# Altium footprint library miniFOC-foc_pcblib.PcbLib: 55 footprints (part 2 of 4)
Each footprint in its own frame and in the unit in brackets; x right, y up, seen from the top. Pads: shape width x height; smd on the part's side, far side on the other; paste and mask are expansions set on the pad; w line width, h text height; cw(c..) or ccw(c..) is an arc to the next point about the centre after c.
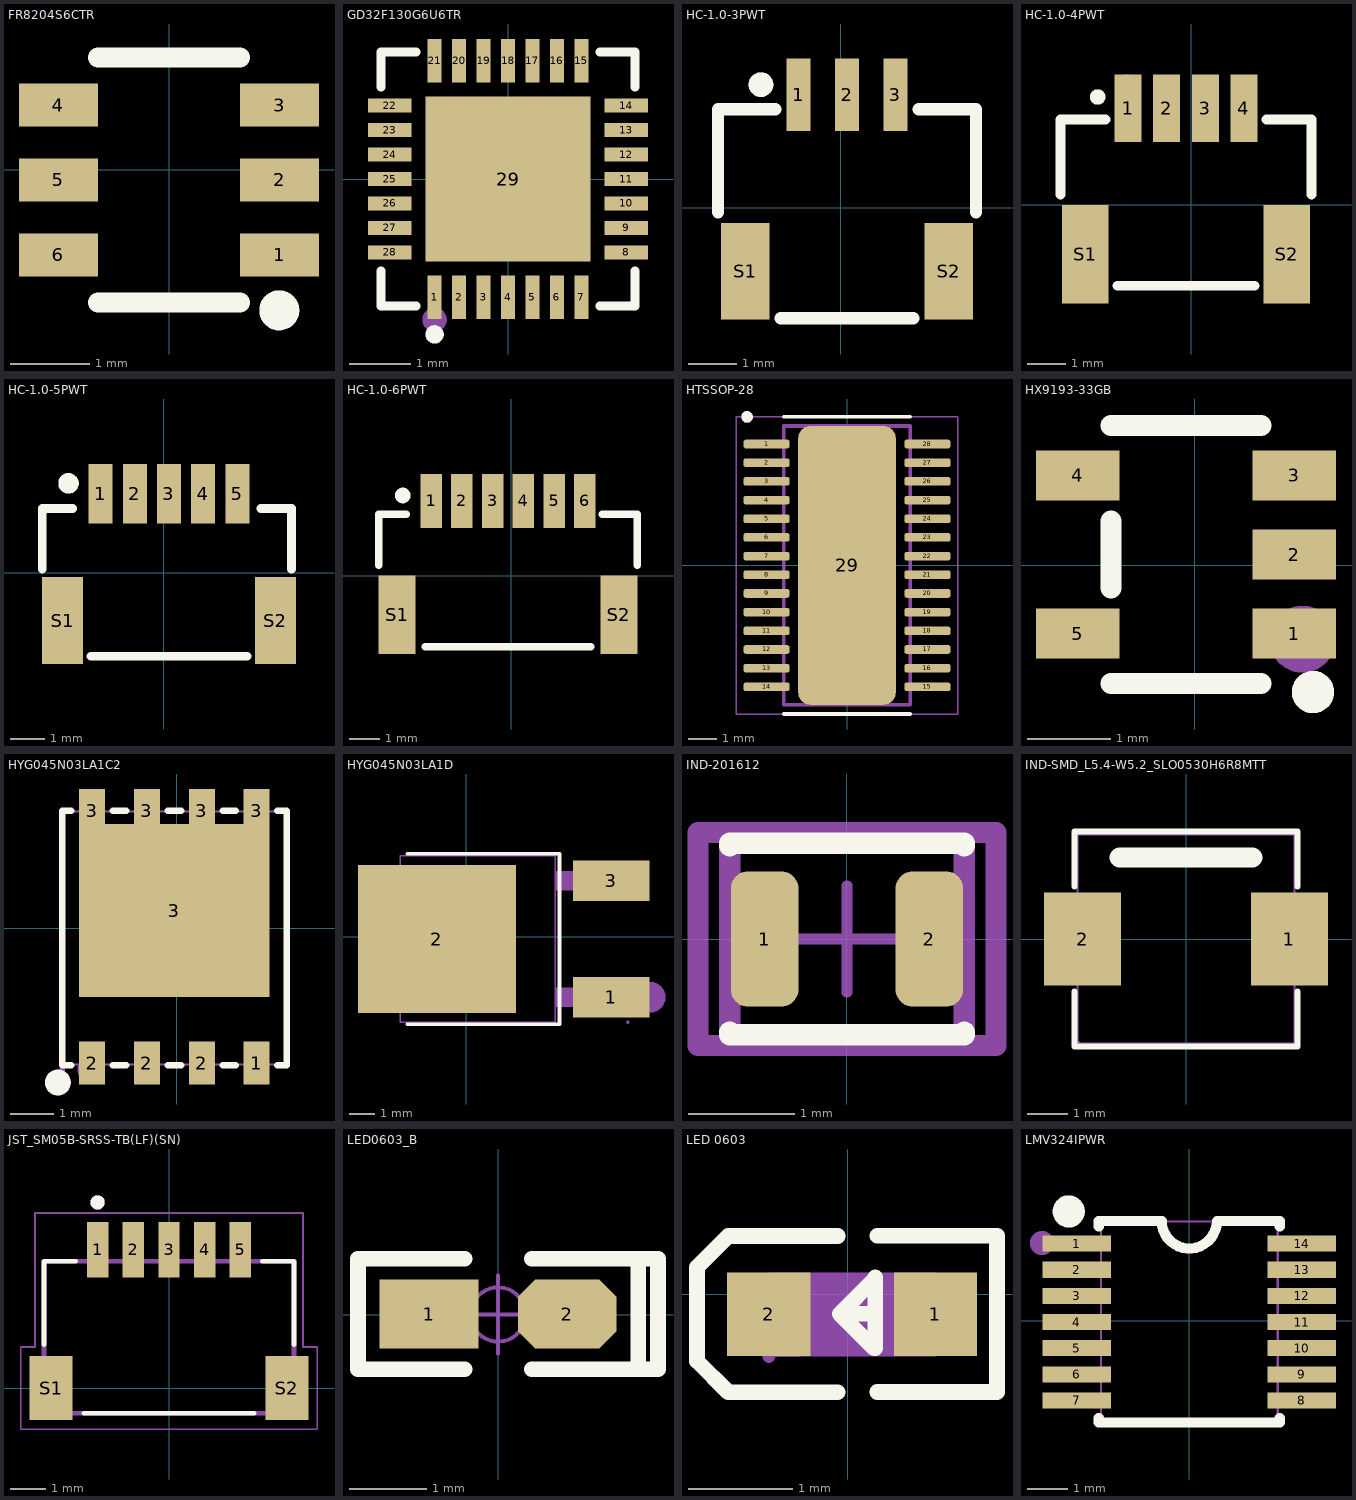
[diagram p1: the footprints below, top view; thin cyan lines are the x and y axes]

## FR8204S6CTR [mm] "SOT-23-6, DC/DC Buck"
pads (6):
  rect 1x0.55 smd: 1(1.395,-1.077) 2(1.395,-0.127) 3(1.395,0.823) 4(-1.405,0.823) 5(-1.405,-0.127) 6(-1.405,-1.077)
Top Overlay:
  circle w0.254: c1.392,-1.778 r0.127
  lines w0.254: -0.905,-1.677 0.895,-1.677 ; -0.905,1.423 0.895,1.423
Mechanical 15:
  circle w0.2: c1.395,-1.077 r0.1
3D body "SOT-23-6.STEP": height 1, standoff 0, extent -1.212,-1.609 1.175,1.291

## GD32F130G6U6TR [mil] "QFN 28 pin,s ARM Cortex-M3 RISC MCU"
pads (29):
  rect 8.82x28 smd: 1(-47.24,-76.1) 2(-31.5,-76.1) 3(-15.75,-76.1) 4(0,-76.1) 5(15.75,-76.1) 6(31.5,-76.1) 7(47.24,-76.1) 15(47.24,76.1) 16(31.5,76.1) 17(15.75,76.1) 18(0,76.1) 19(-15.75,76.1) 20(-31.5,76.1) 21(-47.24,76.1)
  rect 28x8.82 smd: 8(76.1,-47.24) 9(76.1,-31.5) 10(76.1,-15.75) 11(76.1,0) 12(76.1,15.75) 13(76.1,31.5) 14(76.1,47.24) 22(-76.1,47.24) 23(-76.1,31.5) 24(-76.1,15.75) 25(-76.1,0) 26(-76.1,-15.75) 27(-76.1,-31.5) 28(-76.1,-47.24)
  rect 106.3x106.3 smd: 29(0,0)
Top Overlay:
  circle w5.91: c-47.24,-100 r2.95
  lines w6: -81.74,-59.15 -81.74,-81.74 -59.15,-81.74 ; -81.74,59.15 -81.74,81.74 -59.15,81.74 ; 59.15,-81.74 81.74,-81.74 81.74,-59.15 ; 59.15,81.74 81.74,81.74 81.74,59.15
Mechanical 15:
  circle w7.87: c-47.24,-90.55 r3.94
3D body "QFN-28 (4x4x0.9).step": height 36.22, standoff 0, extent -78.43,-78.48 79.05,79

## HC-1.0-3PWT [mm] "HC-1.0-3PWT SMD,P=1mm"
pads (5):
  rect 0.5x1.5 smd: 1(-0.873,2.333) 2(0.127,2.333) 3(1.127,2.333)
  rect 1x2 smd: S1(-1.973,-1.317) S2(2.227,-1.317)
Top Overlay:
  circle w0.254: c-1.651,2.54 r0.127
  lines w0.254: -2.54,-0.096 -2.54,2.032 -1.354,2.032 ; -1.242,-2.286 1.496,-2.286 ; 1.608,2.032 2.794,2.032 2.794,-0.096
Mechanical 15:
  circle w0.254: c-1.651,2.54 r0.127
3D body "SM03B-SRSS-TB(LF)(SN)--3DModel-STEP-56544.STEP": height 3.25, standoff 0.3, extent -2.373,-2.244 2.627,2.706

## HC-1.0-4PWT [mm] "HC-1.0-4PWT SMD,P=1mm"
pads (6):
  rect 0.7x1.75 smd: 1(-1.642,2.502) 2(-0.642,2.502) 3(0.358,2.502) 4(1.358,2.502)
  rect 1.2x2.55 smd: S1(-2.752,-1.287) S2(2.468,-1.287)
Top Overlay:
  circle w0.2: c-2.428,2.791 r0.1
  lines w0.254: -3.392,0.264 -3.392,2.207 -2.223,2.207 -2.853,2.207 ; -1.921,-2.098 1.637,-2.098 ; 1.939,2.207 3.108,2.207 3.108,0.264
Mechanical 15:
  circle w0.2: c-1.666,3.172 r0.1
3D body "SM04B-SRSS-TB(LF)(SN)--3DModel-STEP-56544.STEP": height 3.25, standoff 0.3, extent -3.127,-2.498 2.873,2.452

## HC-1.0-5PWT [mm] "HC-1.0-5PWT SMD,P=1mm"
pads (7):
  rect 0.7x1.75 smd: 1(-1.849,2.318) 2(-0.849,2.318) 3(0.151,2.318) 4(1.151,2.318) 5(2.151,2.318)
  rect 1.2x2.55 smd: S1(-2.959,-1.392) S2(3.261,-1.392)
Top Overlay:
  circle w0.3: c-2.786,2.622 r0.15
  lines w0.254: -3.556,0.114 -3.556,1.886 -2.667,1.886 ; -2.127,-2.432 2.43,-2.432 ; 2.842,1.886 3.731,1.886 3.731,0.114
3D body "step_temp.STEP": height 2.95, standoff 0, extent -3.373,-2.528 3.627,2.422

## HC-1.0-6PWT [mm] "HC-1.0-6PWT SMD,P=1mm"
pads (8):
  rect 0.7x1.75 smd: 1(-2.611,2.445) 2(-1.611,2.445) 3(-0.611,2.445) 4(0.389,2.445) 5(1.389,2.445) 6(2.389,2.445)
  rect 1.2x2.55 smd: S1(-3.721,-1.265) S2(3.499,-1.265)
Top Overlay:
  circle w0.254: c-3.54,2.622 r0.127
  lines w0.254: -4.318,0.362 -4.318,2.013 -3.429,2.013 ; -2.794,-2.305 2.572,-2.305 ; 2.97,2.013 4.096,2.013 4.096,0.362
Mechanical 15:
  circle w0.254: c-2.651,2.368 r0.127
3D body "SM06B-SRSS-TB-LF--SN---3DModel-STEP-56544.STEP": height 2.95, standoff 0, extent -4.123,-2.183 3.877,2.766

## HTSSOP-28 [mm]
height 4.3
pads (29):
  rrect50% 1.6x0.3 smd paste-2 mask+0: 1(-2.8,4.225) 2(-2.8,3.575) 3(-2.8,2.925) 4(-2.8,2.275) 5(-2.8,1.625) 6(-2.8,0.975) 7(-2.8,0.325) 8(-2.8,-0.325) 9(-2.8,-0.975) 10(-2.8,-1.625) 11(-2.8,-2.275) 12(-2.8,-2.925) 13(-2.8,-3.575) 14(-2.8,-4.225) 15(2.8,-4.225) 16(2.8,-3.575) 17(2.8,-2.925) 18(2.8,-2.275) 19(2.8,-1.625) 20(2.8,-0.975) 21(2.8,-0.325) 22(2.8,0.325) 23(2.8,0.975) 24(2.8,1.625) 25(2.8,2.275) 26(2.8,2.925) 27(2.8,3.575) 28(2.8,4.225)
  rrect25% 3.4x9.7 smd paste-6 mask+0: 29(0,0)
Top Overlay:
  circle w0.2: c-3.478,5.17 r0.1
  lines w0.127: -2.2,-5.17 2.2,-5.17 ; -2.2,5.17 2.2,5.17
Top Paste:
  region: 1.2,-3.23 -1.2,-3.23 -1.2,3.23 1.2,3.23
  region: -2.025,4.1 -3.575,4.1 -3.575,4.35 -2.025,4.35
  region: 3.575,4.1 2.025,4.1 2.025,4.35 3.575,4.35
  region: -2.025,3.45 -3.575,3.45 -3.575,3.7 -2.025,3.7
  region: 3.575,3.45 2.025,3.45 2.025,3.7 3.575,3.7
  region: -2.025,2.8 -3.575,2.8 -3.575,3.05 -2.025,3.05
  region: 3.575,2.8 2.025,2.8 2.025,3.05 3.575,3.05
  region: -2.025,2.15 -3.575,2.15 -3.575,2.4 -2.025,2.4
  region: 3.575,2.15 2.025,2.15 2.025,2.4 3.575,2.4
  region: -2.025,1.5 -3.575,1.5 -3.575,1.75 -2.025,1.75
  region: 3.575,1.5 2.025,1.5 2.025,1.75 3.575,1.75
  region: -2.025,0.85 -3.575,0.85 -3.575,1.1 -2.025,1.1
  region: 3.575,0.85 2.025,0.85 2.025,1.1 3.575,1.1
  region: -2.025,0.2 -3.575,0.2 -3.575,0.45 -2.025,0.45
  region: 3.575,0.2 2.025,0.2 2.025,0.45 3.575,0.45
  region: -2.025,-0.45 -3.575,-0.45 -3.575,-0.2 -2.025,-0.2
  region: -2.025,-1.1 -3.575,-1.1 -3.575,-0.85 -2.025,-0.85
  region: -2.025,-1.75 -3.575,-1.75 -3.575,-1.5 -2.025,-1.5
  region: -2.025,-2.4 -3.575,-2.4 -3.575,-2.15 -2.025,-2.15
  region: -2.025,-3.05 -3.575,-3.05 -3.575,-2.8 -2.025,-2.8
  region: -2.025,-3.7 -3.575,-3.7 -3.575,-3.45 -2.025,-3.45
  region: -2.025,-4.35 -3.575,-4.35 -3.575,-4.1 -2.025,-4.1
  region: 3.575,-0.45 2.025,-0.45 2.025,-0.2 3.575,-0.2
  region: 3.575,-1.1 2.025,-1.1 2.025,-0.85 3.575,-0.85
  region: 3.575,-1.75 2.025,-1.75 2.025,-1.5 3.575,-1.5
  region: 3.575,-2.4 2.025,-2.4 2.025,-2.15 3.575,-2.15
  region: 3.575,-3.05 2.025,-3.05 2.025,-2.8 3.575,-2.8
  region: 3.575,-3.7 2.025,-3.7 2.025,-3.45 3.575,-3.45
  region: 3.575,-4.35 2.025,-4.35 2.025,-4.1 3.575,-4.1
Top Solder:
  region: 1.2,-3.23 -1.2,-3.23 -1.2,3.23 1.2,3.23
  region: -1.93,4.005 -3.67,4.005 -3.67,4.445 -1.93,4.445
  region: 3.67,4.005 1.93,4.005 1.93,4.445 3.67,4.445
  region: -1.93,3.355 -3.67,3.355 -3.67,3.795 -1.93,3.795
  region: 3.67,3.355 1.93,3.355 1.93,3.795 3.67,3.795
  region: -1.93,2.705 -3.67,2.705 -3.67,3.145 -1.93,3.145
  region: 3.67,2.705 1.93,2.705 1.93,3.145 3.67,3.145
  region: -1.93,2.055 -3.67,2.055 -3.67,2.495 -1.93,2.495
  region: 3.67,2.055 1.93,2.055 1.93,2.495 3.67,2.495
  region: -1.93,1.405 -3.67,1.405 -3.67,1.845 -1.93,1.845
  region: 3.67,1.405 1.93,1.405 1.93,1.845 3.67,1.845
  region: -1.93,0.755 -3.67,0.755 -3.67,1.195 -1.93,1.195
  region: 3.67,0.755 1.93,0.755 1.93,1.195 3.67,1.195
  region: -1.93,0.105 -3.67,0.105 -3.67,0.545 -1.93,0.545
  region: 3.67,0.105 1.93,0.105 1.93,0.545 3.67,0.545
  region: -1.93,-0.545 -3.67,-0.545 -3.67,-0.105 -1.93,-0.105
  region: -1.93,-1.195 -3.67,-1.195 -3.67,-0.755 -1.93,-0.755
  region: -1.93,-1.845 -3.67,-1.845 -3.67,-1.405 -1.93,-1.405
  region: -1.93,-2.495 -3.67,-2.495 -3.67,-2.055 -1.93,-2.055
  region: -1.93,-3.145 -3.67,-3.145 -3.67,-2.705 -1.93,-2.705
  region: -1.93,-3.795 -3.67,-3.795 -3.67,-3.355 -1.93,-3.355
  region: -1.93,-4.445 -3.67,-4.445 -3.67,-4.005 -1.93,-4.005
  region: 3.67,-0.545 1.93,-0.545 1.93,-0.105 3.67,-0.105
  region: 3.67,-1.195 1.93,-1.195 1.93,-0.755 3.67,-0.755
  region: 3.67,-1.845 1.93,-1.845 1.93,-1.405 3.67,-1.405
  region: 3.67,-2.495 1.93,-2.495 1.93,-2.055 3.67,-2.055
  region: 3.67,-3.145 1.93,-3.145 1.93,-2.705 3.67,-2.705
  region: 3.67,-3.795 1.93,-3.795 1.93,-3.355 3.67,-3.355
  region: 3.67,-4.445 1.93,-4.445 1.93,-4.005 3.67,-4.005
Mechanical 13:
  circle w0.2: c-3.478,5.17 r0.1
  lines w0.127: -2.2,-4.85 2.2,-4.85 2.2,4.85 -2.2,4.85 -2.2,-4.85
Mechanical 15:
  lines w0.05: -3.85,-5.17 3.85,-5.17 3.85,5.17 -3.85,5.17 -3.85,-5.17
3D body "step_temp.STEP": height 1.2, standoff 0, extent -3.2,-4.85 3.2,4.85

## HX9193-33GB [mm] "SOT-23-5, Vin=6V, Vout=3.3V, 600mA, 1kHz"
pads (5):
  rect 1x0.6 smd: 1(1.195,-0.823) 2(1.195,0.127) 3(1.195,1.077) 4(-1.405,1.077) 5(-1.405,-0.823)
Top Overlay:
  circle w0.254: c1.419,-1.524 r0.127
  lines w0.254: -1.005,-1.423 0.795,-1.423 ; -1.005,-0.273 -1.005,0.527 ; -1.005,1.677 0.795,1.677
Mechanical 15:
  circle w0.4: c1.292,-0.889 r0.2
3D body "SOT-23-5.STEP": height 1.5, standoff 0, extent -1.537,-1.323 1.283,1.577

## HYG045N03LA1C2 [mm] "NMOS"
pads (9):
  rect 0.6x1 smd mask+0.05: 1(1.851,-3.121) 2(-1.959,-3.121) 2(-0.689,-3.121) 2(0.581,-3.121) 3(-1.959,2.729) 3(-0.689,2.729) 3(0.581,2.729) 3(1.851,2.729)
  rect 4.41x4 smd mask+0.05: 3(-0.054,0.414)
Top Overlay:
  circle w0.3: c-2.754,-3.571 r0.15
  lines w0.152: -2.439,-3.171 -2.654,-3.171 -2.654,2.729 -2.439,2.729 ; -1.479,-3.171 -1.169,-3.171 ; -1.479,2.729 -1.169,2.729 ; -0.209,-3.171 0.101,-3.171 ; -0.209,2.729 0.101,2.729 ; 1.061,-3.171 1.371,-3.171 ; 1.061,2.729 1.371,2.729 ; 2.331,-3.171 2.546,-3.171 2.546,2.729 2.331,2.729
Top Paste:
  region: -2.259,-3.621 -1.659,-3.621 -1.659,-2.621 -2.259,-2.621
  region: -0.989,-3.621 -0.389,-3.621 -0.389,-2.621 -0.989,-2.621
  region: 0.281,-3.621 0.881,-3.621 0.881,-2.621 0.281,-2.621
  region: 1.551,-3.621 2.151,-3.621 2.151,-2.621 1.551,-2.621
  region: 2.151,3.229 1.551,3.229 1.551,2.414 0.881,2.414 0.881,3.229 0.281,3.229 0.281,2.414 -0.389,2.414 -0.389,3.229 -0.989,3.229 -0.989,2.414 -1.659,2.414 -1.659,3.229 -2.259,3.229 -2.259,-1.586 2.151,-1.586
Mechanical 6:
  circle w0.3: c-2.004,-3.271 r0.15
Mechanical 15:
  region: -2.179,-1.466 -2.179,2.354 2.071,2.354 2.071,-1.466
  region: -2.159,-2.671 -1.759,-2.671 -1.759,-3.271 -2.159,-3.271
  region: -0.889,-2.671 -0.489,-2.671 -0.489,-3.271 -0.889,-3.271
  region: 0.381,-2.671 0.781,-2.671 0.781,-3.271 0.381,-3.271
  region: 1.651,-2.671 2.051,-2.671 2.051,-3.271 1.651,-3.271
  region: 1.651,2.879 2.051,2.879 2.051,2.279 1.651,2.279
  region: 0.381,2.879 0.781,2.879 0.781,2.279 0.381,2.279
  region: -0.889,2.879 -0.489,2.879 -0.489,2.279 -0.889,2.279
  region: -2.159,2.879 -1.759,2.879 -1.759,2.279 -2.159,2.279
  region: -2.594,-3.271 -2.594,-3.246 -2.629,-3.211 -2.679,-3.211 -2.714,-3.246 -2.714,-3.271 -2.714,-3.296 -2.679,-3.331 -2.629,-3.331 -2.594,-3.296
  lines w0.051: -2.654,-3.151 2.546,-3.151 2.546,2.709 -2.654,2.709 -2.654,-3.151

## HYG045N03LA1D [mil] "NMOS 30V 80A"
pads (3):
  rect 118.1x63 smd mask+2: 1(224.48,-93.38) 3(224.48,86.62)
  rect 244.1x228.3 smd mask+2: 2(-45.12,-3.38)
Top Overlay:
  lines w6: -90.82,-135.08 144.08,-135.08 144.08,128.32 -90.82,128.32
Mechanical 6:
  circle w23.6: c284.68,-93.38 r11.8
Mechanical 15:
  region: 251.98,-132.08 251.98,-131.09 250.58,-129.68 248.59,-129.68 247.18,-131.09 247.18,-132.08 247.18,-133.08 248.59,-134.48 250.58,-134.48 251.98,-133.08
  region: 186.98,71.62 186.98,101.52 249.58,101.52 249.58,71.62
  region: 137.38,71.62 137.38,101.52 187.38,101.52 187.38,71.62
  region: 186.98,-108.28 186.98,-78.38 249.58,-78.38 249.58,-108.28
  region: 137.28,-108.28 137.28,-78.38 187.38,-78.38 187.38,-108.28
  region: -150.42,-107.28 -150.42,100.52 60.18,100.52 60.18,-107.28
  lines w2: -102.22,-132.08 137.78,-132.08 137.78,125.32 -102.22,125.32 -102.22,-132.08

## IND-201612 [mm]
height 4.3
pads (2):
  rrect50% 0.635x1.27 smd paste+0 mask+0: 1(-0.774,0) 2(0.774,0)
Top Overlay:
  lines w0.2: -1.1,-0.875 -1.1,-0.9 1.1,-0.9 1.1,-0.875 ; -1.1,0.875 -1.1,0.9 1.1,0.9 1.1,0.875
Mechanical 10:
  lines w0.2: -1.4,-1 -1.4,1 1.4,1 1.4,-1 -1.4,-1
Mechanical 12:
  lines w0.2: -1.1,-0.9 -1.1,0.9 1.1,0.9 1.1,-0.9 -1.1,-0.9
Mechanical 15:
  lines w0.1: -0.5,0 0.5,0 ; 0,-0.5 0,0.5
  lines w0.2: -1.4,-1 -1.4,1 1.4,1 1.4,-1 -1.4,-1
3D body "Ind_Murata.step": height 0.95, standoff 0, extent -1,-0.8 1,0.8

## IND-SMD_L5.4-W5.2_SLO0530H6R8MTT [mm]
pads (2):
  rect 1.924x2.32 smd: 1(2.578,0) 2(-2.578,0)
Top Overlay:
  lines w0.152: -2.776,-1.312 -2.776,-2.676 2.776,-2.676 2.776,-1.312 ; -2.776,1.312 -2.776,2.676 2.776,2.676 2.776,1.312
  lines w0.508: -1.651,2.032 1.651,2.032
Mechanical 15:
  region: -2.7,-0.95 -2.7,0.95 -1.7,0.95 -1.7,-0.95
  region: 2.7,-0.95 2.7,0.95 1.7,0.95 1.7,-0.95
  region: -2.64,-2.6 -2.64,-2.575 -2.675,-2.54 -2.725,-2.54 -2.76,-2.575 -2.76,-2.6 -2.76,-2.625 -2.725,-2.66 -2.675,-2.66 -2.64,-2.625 -2.64,-2.6
  lines w0.051: -2.7,-2.6 -2.7,2.6 2.7,2.6 2.7,-2.6 -2.7,-2.6

## JST_SM05B-SRSS-TB(LF)(SN) [mm]
pads (7):
  rect 0.6x1.55 smd: 1(-2,3.875) 2(-1,3.875) 3(0,3.875) 4(1,3.875) 5(2,3.875)
  rect 1.2x1.8 smd: S1(-3.3,0) S2(3.3,0)
Top Overlay:
  circle w0.2: c-2,5.2 r0.1
  lines w0.127: -3.5,1.21 -3.5,3.55 -2.61,3.55 ; -2.39,-0.7 2.39,-0.7 ; 2.61,3.55 3.5,3.55 3.5,1.21
Mechanical 13:
  circle w0.2: c-2,5.2 r0.1
  lines w0.127: -3.5,-0.7 3.5,-0.7 3.5,3.55 -3.5,3.55 -3.5,-0.7
Mechanical 15:
  lines w0.05: -4.15,-1.15 4.15,-1.15 4.15,1.15 3.75,1.15 3.75,4.9 -3.75,4.9 -3.75,1.15 -4.15,1.15 -4.15,-1.15
3D body "step_temp.STEP": height 2.95, standoff 0, extent -3.5,-0.75 3.5,4.2

## LED0603_B [mil] "蓝色0603LED"
pads (2):
  rect 50x35 smd: 1(-35,0.26)
  oct 50x35 smd: 2(35,0.26)
Top Overlay:
  lines w8: -17,-27.74 -71,-27.74 -71,-25.74 -71,28.26 -70,28.26 -17,28.26 ; 17,-27.74 70,-27.74 ; 17,28.26 71,28.26 81,28.26 81,-27.74 71,-27.74 71,26.26
Mechanical 15:
  circle w1.97: c0,0 r13.78
  lines w1.97: -19.68,0 19.68,0 ; 0,-19.68 0,19.68
3D body "LED_0603-B.STEP": height 18.33, standoff -0.04, extent -31.5,-15.79 31.49,15.79
3D body "LED 0603玻璃罩.": height 0, standoff 0, extent 0,0 0,0

## LED 0603 [mm]
pads (2):
  rect 0.8x0.8 smd: 1(0.84,-0.192) 2(-0.759,-0.192)
Top Overlay:
  lines w0.15: -0.099,-0.941 -1.149,-0.941 -1.449,-0.641 -1.449,-0.541 -1.449,0.159 -1.449,0.259 -1.149,0.559 -0.099,0.559 ; 0.261,-0.189 -0.079,-0.189 ; 0.281,-0.939 1.431,-0.939 ; 0.281,0.561 1.431,0.561 1.431,-0.919 ; -0.079,-0.189 0.261,0.151 0.261,0.161 0.261,-0.519 0.251,-0.519 -0.079,-0.189
Mechanical 4:
  region: -0.759,-0.595 -0.759,0.205 0.841,0.205 0.841,-0.595
Mechanical 5:
  region: 0.541,-0.592 0.541,0.208 0.841,0.208 0.841,-0.592
  region: -0.759,-0.599 -0.759,0.201 -0.459,0.201 -0.459,-0.599
Mechanical 6:
  circle w0.06: c-0.759,-0.599 r0.03
Mechanical 15:
  region: 0.57,-0.127 1.11,-0.127 1.11,-0.257 0.57,-0.257
  region: 0.775,-0.462 0.775,0.078 0.905,0.078 0.905,-0.462
  region: -1.029,-0.134 -0.489,-0.134 -0.489,-0.264 -1.029,-0.264
3D body "LED0603.STEP": height 0.6, standoff 0, extent -0.81,-0.592 0.81,0.208

## LMV324IPWR [mil] "TSSOP-14 Operational Amplifier"
pads (14):
  rect 66.9x15.7 smd mask+2: 1(-110.1,75.6) 2(-110.1,50) 3(-110.1,24.4) 4(-110.1,-1.2) 5(-110.1,-26.8) 6(-110.1,-52.4) 7(-110.1,-78) 8(110.3,-78) 9(110.3,-52.4) 10(110.3,-26.8) 11(110.3,-1.2) 12(110.3,24.4) 13(110.3,50) 14(110.3,75.6)
Top Overlay:
  circle w15.7: c-118,107.1 r7.9
  lines w10: -88.5,-95.1 -88.5,-99.6 88.7,-99.6 88.7,-95.1 ; -88.5,92.7 -88.5,97.2 ; -88.5,97.8 -62.9,97.8 -26.9,97.8 ccw(c0.1,97.8) 27.1,97.8 63.1,97.8 88.7,97.8 ; 88.7,92.7 88.7,97.2
Mechanical 6:
  circle w11.8: c-144.1,76.1 r5.9
Mechanical 15:
  drawing of 33 lines, arcs and shapes, not listed